# Altium footprint library PacBot.PcbLib: 10 footprints
Each footprint in its own frame and in the unit in brackets; x right, y up, seen from the top. Pads: shape width x height; smd on the part's side, far side on the other; paste and mask are expansions set on the pad; w line width, h text height; cw(c..) or ccw(c..) is an arc to the next point about the centre after c.
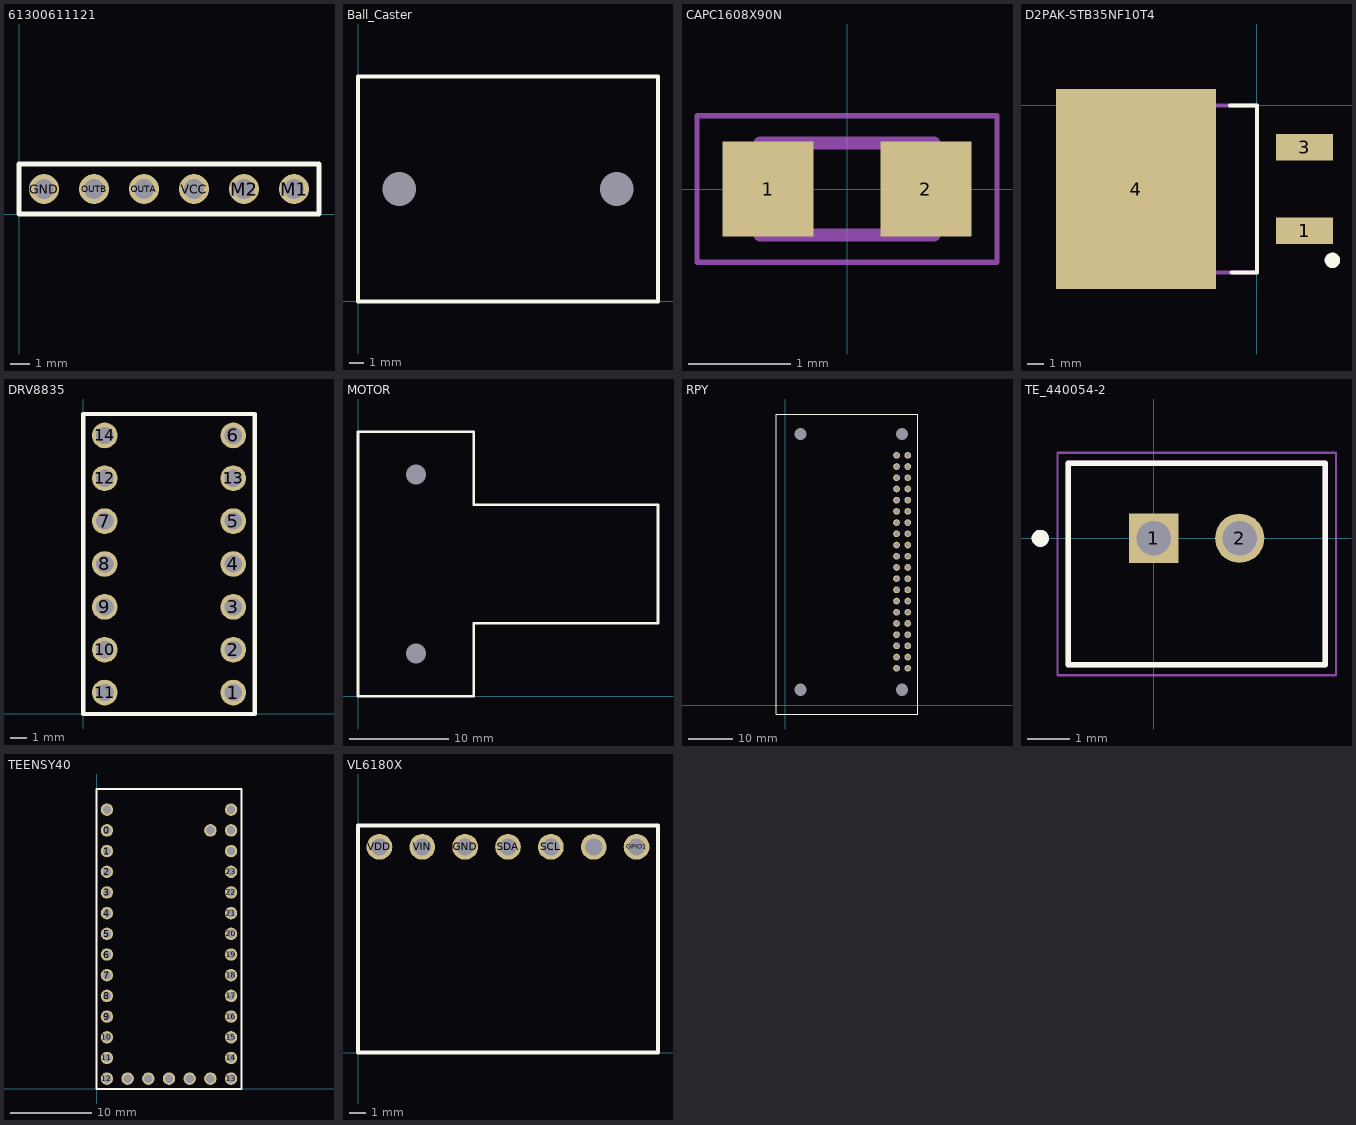
[diagram p0: the footprints below, top view; thin cyan lines are the x and y axes]

## 61300611121 [mil] "Pin Header, pitch 2.54 mm, THT, Vertical, single row, 6p"
height 336.22
pads (6):
  round 60 hole 40: GND(50,50) M1(550,50) M2(450,50) OUTA(250,50) OUTB(150,50) VCC(350,50)
Top Overlay:
  lines w10: 0,0 600,0 600,100 0,100 0,0
3D body "61300611121_Download_STP_61300611121_rev1.stp": height 336.22, standoff -118.11, extent 0,1.89 600,101.89

## Ball_Caster [mil] "2_HOLES_W800MIL_L600MIL"
height 530
pads (2):
  round 10 hole 90: ""(110,300)
  round 50 hole 90: ""(690,300)
Top Overlay:
  lines w10: 0,0 0,600 800,600 800,0 0,0
3D body "pololu-ball-caster-with-0-500in-ball.step": height -17.5, standoff -549.4, extent 0.35,0.07 799.65,599.93

## CAPC1608X90N [mm]
pads (2):
  rect 0.89x0.93 smd: 1(-0.77,0) 2(0.77,0)
Mechanical 13:
  lines w0.127: -0.85,-0.45 -0.85,0.45 0.85,0.45 0.85,-0.45 -0.85,-0.45
Mechanical 15:
  lines w0.05: -1.465,-0.715 -1.465,0.715 1.465,0.715 1.465,-0.715 -1.465,-0.715

## D2PAK-STB35NF10T4 [mm]
pads (3):
  rect 3.5x1.6 smd: 1(2.904,-7.64) 3(2.904,-2.56)
  rect 9.75x12.2 smd: 4(-7.371,-5.1)
Top Overlay:
  circle w0.5: c4.603,-9.449 r0.219
  lines w0.254: -1.644,0 0,0 0,-10.2 -1.535,-10.2
Mechanical 15:
  lines w0.254: -9.15,-10.2 0,-10.2 0,0 -9.15,0 -9.15,-10.2
3D body "L7805ACD2T-TR.stp": height 5.8, standoff -4.65, extent -10,-3.376 10,3.376

## DRV8835 [mil] "14_PIN_W400MIL_H700MIL"
height 111
pads (14):
  round 60 hole 40: 1(350,50) 2(350,150) 3(350,250) 4(350,350) 5(350,450) 6(350,650) 7(50,450) 8(50,350) 9(50,250) 10(50,150) 11(50,50) 12(50,550) 13(350,550) 14(50,650)
Top Overlay:
  lines w10: 0,0 0,700 400,700 400,0 0,0
  text ".Designator" at -90,729.99 h60
3D body "drv8835-dual-motor-driver-carrier.step": height 110.87, standoff 0, extent 0,0 400,700

## MOTOR [mil] "W460MIL_L1050MIL"
height 460
pads (2):
  round 60 hole 80: ""(230,170) ""(230,880)
Top Overlay:
  lines w10: 0,0 460,0 460,290 1190,290 1190,760 460,760 460,1050 0,1050 0,0
3D body "pololu-wheel-32x7mm-black.step": height 829.92, standoff -429.92, extent -300,-109.84 38.58,1150
3D body "micro-metal-gearmotor-with-1086-bracket.step": height 458.78, standoff -1.85, extent -299.29,-1.65 1089.29,1041.65

## RPY [mil] "40_PIN_W32MM_h68MM"
height 196.85
pads (44):
  round 60 hole 40: 1(993.5,2229.33) 2(1093.5,2229.33) 3(993.5,2129.33) 4(1093.5,2129.33) 5(993.5,2029.33) 6(1093.5,2029.33) 7(993.5,1929.33) 8(1093.5,1929.33) 9(993.5,1829.33) 10(1093.5,1829.33) 11(993.5,1729.33) 12(1093.5,1729.33) 13(993.5,1629.33) 14(1093.5,1629.33) 15(993.5,1529.33) 16(1093.5,1529.33) 17(993.5,1429.33) 18(1093.5,1429.33) 19(993.5,1329.33) 20(1093.5,1329.33) 21(993.5,1229.33) 22(1093.5,1229.33) 23(993.5,1129.33) 24(1093.5,1129.33) 25(993.5,1029.33) 26(1093.5,1029.33) 27(993.5,929.33) 28(1093.5,929.33) 29(993.5,829.33) 30(1093.5,829.33) 31(993.5,729.33) 32(1093.5,729.33) 33(993.5,629.33) 34(1093.5,629.33) 35(993.5,529.33) 36(1093.5,529.33) 37(993.5,429.33) 38(1093.5,429.33) 39(993.5,329.33) 40(1093.5,329.33)
  round 60 hole 108.27: MH(137.8,137.8) MH(137.8,2421.26) MH(1043.31,137.8) MH(1043.31,2421.26)
Top Overlay:
  lines w10: -78.74,-78.74 -78.74,2598.43 1181.1,2598.43 1181.1,-78.74 -78.74,-78.74
  text ".Designator" at 285.59,2667.79 h60
3D body "RaspberryPiZeroW.STEP": height 188.98, standoff 0, extent -59.21,-35.81 1171.1,2558.67

## TE_440054-2 [mm]
pads (2):
  rect 1.15x1.15 / inner round 1.15 / far side rect 1.15x1.15 hole 0.8: 1(0,0)
  round 1.15 hole 0.8: 2(2.007,0)
Top Overlay:
  circle w0.2: c-2.65,0 r0.1
  lines w0.127: -2,-2.95 -2,1.75 4.007,1.75 4.007,-2.95 -2,-2.95
Mechanical 13:
  circle w0.2: c-2.65,0 r0.1
  lines w0.127: -2,-2.95 -2,1.75 4.007,1.75 4.007,-2.95 ; -2,-2.95 4.007,-2.95 ; -2,-2.95 4.007,-2.95
Mechanical 15:
  lines w0.05: -2.25,-3.2 -2.25,2 4.257,2 4.257,-3.2 -2.25,-3.2
3D body "c-440054-2-f4-3d.stp": height 6.1, standoff -3.35, extent -1.936,-3.112 4.064,1.588

## TEENSY40 [mil] "33_PIN_W700MIL_H1450MIL"
height 200
pads (34):
  round 60 hole 40: 0(50,1250) 1(50,1150) 2(50,1050) 3(50,950) 3.3V(250,50) 3.3V(650,1150) 4(50,850) 5(50,750) 6(50,650) 7(50,550) 8(50,450) 9(50,350) 10(50,250) 11(50,150) 12(50,50) 13(650,50) 14(650,150) 15(650,250) 16(650,350) 17(650,450) 18(650,550) 19(650,650) 20(650,750) 21(650,850) 22(650,950) 23(650,1050) GND(50,1350) GND(350,50) GND(650,1250) ON/OFF(550,50) PROGRAM(450,50) VBAT(150,50) VIN(650,1350) VUSB(550,1250)
Top Overlay:
  lines w10: 0,0 0,1450 700,1450 700,0 0,0
  text ".Designator" at 60,1479.99 h60
3D body "Teensy_4.0_Assembly.STEP": height 163.64, standoff 1.23, extent 0,1.57 696.85,1448.43

## VL6180X [mil] "7_PIN_W700MIL_L530MIL"
height 500
pads (7):
  round 60 hole 40: GND(250,480) GPIO0/CE(550,480) GPIO1(650,480) SCL(450,480) SDA(350,480) VDD(50,480) VIN(150,480)
Top Overlay:
  lines w10: 0,0 700,0 700,530 0,530 0,0
  text ".Designator" at 38.79,559.99 h60
3D body "vl6180x-carrier-model.step": height 500, standoff 0, extent 0,80 700,167.16